# Altium footprint library Inductors&Transformers.PcbLib: 69 footprints (part 2 of 5)
Each footprint in its own frame and in the unit in brackets; x right, y up, seen from the top. Pads: shape width x height; smd on the part's side, far side on the other; paste and mask are expansions set on the pad; w line width, h text height; cw(c..) or ccw(c..) is an arc to the next point about the centre after c.
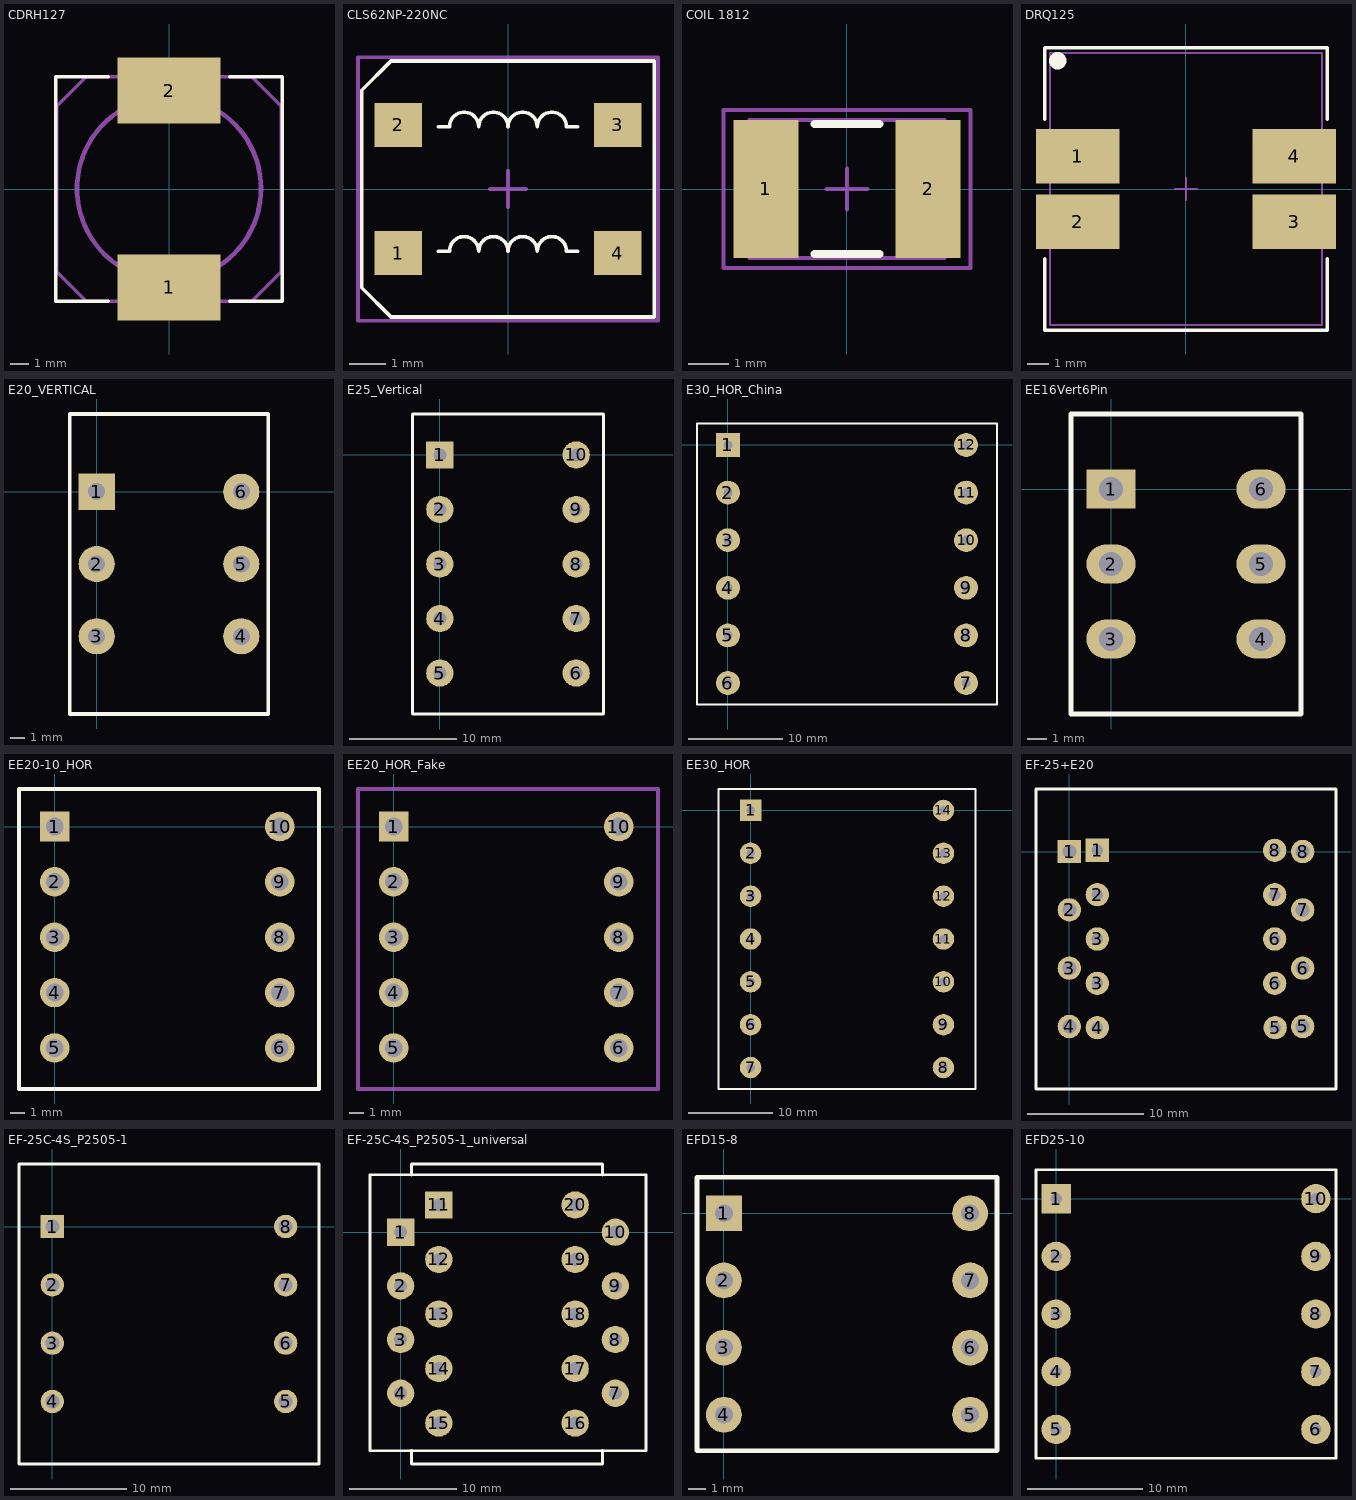
[diagram p1: the footprints below, top view; thin cyan lines are the x and y axes]

## CDRH127 [mm]
height 8
pads (2):
  rect 5.6x3.6 smd: 1(0,-5.35) 2(0,5.35)
Top Overlay:
  lines w0.178: -3.3,-6.1 -6.15,-6.1 -6.15,6.1 -3.3,6.1 ; 3.3,-6.1 6.15,-6.1 6.15,6.1 3.3,6.1
Mechanical 13:
  circle w0.254: c0,0.02 r5
  lines w0.178: -2.5,-6.1 -2.5,-6.4 2.5,-6.4 2.5,-6.1 ; -2.5,6.1 -2.5,6.4 2.5,6.4 2.5,6.1 ; -6.1,-4.5 -6.1,4.5 -4.5,6.1 4.5,6.1 6.1,4.5 6.1,-4.5 4.5,-6.1 -4.5,-6.1 -6.1,-4.5
3D body "SUMIDA-CDRH127.step": height 7.5, standoff 0.05, extent -6,-6.151 6,6.191

## CLS62NP-220NC [mm]
height 2.5
pads (4):
  rect 1.3x1.2 smd: 1(-3,-1.75) 2(-3,1.75) 3(3,1.75) 4(3,-1.75)
Top Overlay:
  lines w0.1: -1.9,-1.7 -1.6,-1.7 cw(c-1.2,-1.7) -0.8,-1.7 cw(c-0.4,-1.7) 0,-1.7 cw(c0.4,-1.7) 0.8,-1.7 cw(c1.2,-1.7) 1.6,-1.7 1.9,-1.7 ; -1.9,1.7 -1.6,1.7 cw(c-1.2,1.7) -0.8,1.7 cw(c-0.4,1.7) 0,1.7 cw(c0.4,1.7) 0.8,1.7 cw(c1.2,1.7) 1.6,1.7 1.9,1.7 ; -4,-2.7 -4,2.7 -3.2,3.5 4,3.5 4,-3.5 -3.2,-3.5 -4,-2.7
Mechanical 13:
  lines w0.1: -0.5,0 0.5,0 ; 0,-0.5 0,0.5 ; -4.1,-3.6 -4.1,3.6 4.1,3.6 4.1,-3.6 -4.1,-3.6
3D body: height 2.5, standoff 0, extent -4,-3.5 4,3.5

## COIL 1812 [mm] "Chip Coil 1812 Size"
height 2.7
pads (2):
  rect 1.6x3.4 smd: 1(-2,0) 2(2,0)
Top Overlay:
  lines w0.2: -0.8,-1.6 0.8,-1.6 ; -0.8,1.6 0.8,1.6
Mechanical 13:
  lines w0.1: -1.8,-1.7 -1.8,1.7 ; 1.8,-1.7 1.8,1.7 ; -2.4,-1.7 2.4,-1.7 2.4,1.7 -2.4,1.7 -2.4,-1.7
Mechanical 15:
  lines w0.1: -0.5,0 0.5,0 ; 0,-0.5 0,0.5 ; -3.05,-1.95 3.05,-1.95 3.05,1.95 -3.05,1.95 -3.05,-1.95
3D body "User Library-L1812.step": height 2.75, standoff 0, extent -2.4,-1.7 2.4,1.7

## DRQ125 [mm] "Coil"
height 6
pads (4):
  rect 3.85x2.5 smd: 1(-4.975,1.5) 2(-4.975,-1.5) 3(4.975,-1.5) 4(4.975,1.5)
Top Overlay:
  circle w0.5: c-5.9,5.9 r0.15
  lines w0.15: -6.5,-3.2 -6.5,-6.5 6.5,-6.5 6.5,-3.2 ; -6.5,3.2 -6.5,6.5 6.5,6.5 6.5,3.2
Mechanical 13:
  lines w0.1: -0.5,0 0.5,0 ; 0,-0.5 0,0.5 ; -6.25,-6.25 -6.25,6.25 6.25,6.25 6.25,-6.25 -6.25,-6.25
3D body "User Library-DRQ127_12_5x12_5.step": height 8, standoff 0, extent -6.25,-6.25 6.25,6.25

## E20_VERTICAL [mm]
height 21.996
pads (6):
  rect 2.54x2.54 hole 1.2: 1(0,0)
  round 2.54 hole 1.2: 2(0,-5.08) 3(0,-10.16) 4(10.16,-10.16) 5(10.16,-5.08) 6(10.16,0)
Top Overlay:
  lines w0.254: -1.905,-15.621 12.065,-15.621 12.065,5.461 -1.905,5.461 -1.905,-15.621
3D body: height 22, standoff 2.54, extent -1.904,-15.62 12.064,5.46

## E25_Vertical [mm]
height 27
pads (10):
  rect 2.54x2.54 hole 1.2: 1(0,0)
  round 2.54 hole 1.2: 2(0,-5.08) 3(0,-10.16) 4(0,-15.24) 5(0,-20.32) 6(12.7,-20.32) 7(12.7,-15.24) 8(12.7,-10.16) 9(12.7,-5.08) 10(12.7,0)
Top Overlay:
  lines w0.254: -2.54,-24.13 15.24,-24.13 15.24,3.81 -2.54,3.81 -2.54,-24.13
3D body "User Library-EE25_13_7_Vertical_transformer.step": height 26.5, standoff -3.4, extent -2.4,-23.66 15.1,3.34

## E30_HOR_China [mm]
height 22.098
pads (12):
  rect 2.54x2.54 hole 1: 1(0,0)
  round 2.54 hole 1: 2(0,-5.08) 3(0,-10.16) 4(0,-15.24) 5(0,-20.32) 6(0,-25.4) 7(25.4,-25.4) 8(25.4,-20.32) 9(25.4,-15.24) 10(25.4,-10.16) 11(25.4,-5.08) 12(25.4,0)
Top Overlay:
  lines w0.254: -3.302,-27.686 28.702,-27.686 28.702,2.286 -3.302,2.286 -3.302,-27.686
3D body: height 22.1, standoff 2.54, extent -3.429,-27.813 28.829,2.413

## EE16Vert6Pin [mm]
height 18.491
pads (6):
  rect 2.5x2 hole 1.2: 1(0,0)
  oval 2.5x2 hole 1.2: 2(0,-3.81) 3(0,-7.62) 4(7.62,-7.62) 5(7.62,-3.81) 6(7.62,0)
Top Overlay:
  lines w0.254: -2.032,-11.43 9.652,-11.43 9.652,3.81 -2.032,3.81 -2.032,-11.43
3D body "User Library-isolator_audio.STEP": height 19.01, standoff -2, extent -1.74,-12.016 9.36,4.197

## EE20-10_HOR [mm]
height 18
pads (10):
  rect 2x2 hole 1.2: 1(0,0)
  round 2 hole 1.2: 2(0,-3.75) 3(0,-7.5) 4(0,-11.25) 5(0,-15) 6(15.25,-15) 7(15.25,-11.25) 8(15.25,-7.5) 9(15.25,-3.75) 10(15.25,0)
Top Overlay:
  lines w0.254: -2.413,-17.78 -2.413,2.54 17.907,2.54 17.907,-17.78 -2.413,-17.78
3D body "User Library-E20-10pin-B66206.STEP": height 16.92, standoff -3.28, extent -3.647,-19.103 18.828,3.914

## EE20_HOR_Fake [mm]
pads (10):
  rect 2x2 hole 1.2: 1(0,0)
  round 2 hole 1.2: 2(0,-3.75) 3(0,-7.5) 4(0,-11.25) 5(0,-15) 6(15.25,-15) 7(15.25,-11.25) 8(15.25,-7.5) 9(15.25,-3.75) 10(15.25,0)
Mechanical 15:
  lines w0.254: -2.413,-17.78 17.907,-17.78 17.907,2.54 -2.413,2.54 -2.413,-17.78

## EE30_HOR [mm]
height 17.983
pads (14):
  rect 2.54x2.54 hole 1: 1(0,0)
  round 2.54 hole 1: 2(0,-5.08) 3(0,-10.16) 4(0,-15.24) 5(0,-20.32) 6(0,-25.4) 7(0,-30.48) 8(22.86,-30.48) 9(22.86,-25.4) 10(22.86,-20.32) 11(22.86,-15.24) 12(22.86,-10.16) 13(22.86,-5.08) 14(22.86,0)
Top Overlay:
  lines w0.254: -3.81,-33.02 -3.81,2.54 26.67,2.54 26.67,-33.02 -3.81,-33.02
3D body: height 17.98, standoff 2.54, extent -3.809,-33.019 26.669,2.539

## EF-25+E20 [mm]
height 20.5
pads (18):
  rect 2x2 hole 1.2: 1(0,0)
  rect 2x2 hole 1: 1(2.4,0.1)
  round 2 hole 1.2: 2(0,-5) 3(0,-10) 4(0,-15) 5(20,-15) 6(20,-10) 7(20,-5) 8(20,0)
  round 2 hole 1: 2(2.4,-3.7) 3(2.4,-11.3) 3(2.4,-7.5) 4(2.4,-15.1) 5(17.64,-15.1) 6(17.6,-11.3) 6(17.6,-7.5) 7(17.6,-3.7) 8(17.6,0.1)
Top Overlay:
  lines w0.254: -2.85,-20.359 22.85,-20.359 22.85,5.359 -2.85,5.359 -2.85,-20.359
3D body: height 20.5, standoff 0, extent -2.849,-20.359 22.849,5.359

## EF-25C-4S_P2505-1 [mm]
height 20.498
pads (8):
  rect 2x2 hole 1.2: 1(0,0)
  round 2 hole 1.2: 2(0,-5) 3(0,-10) 4(0,-15) 5(20,-15) 6(20,-10) 7(20,-5) 8(20,0)
Top Overlay:
  lines w0.254: -2.85,-20.359 22.85,-20.359 22.85,5.359 -2.85,5.359 -2.85,-20.359
3D body "User Library-Choke_E25.STEP": height 21.15, standoff -2.55, extent -3,-21 23,6

## EF-25C-4S_P2505-1_universal [mil]
height 1024
pads (18):
  rect 100x100 hole 47.24: 1(0,0) 11(140,100)
  round 100 hole 47.24: 2(0,-196.85) 3(0,-393.7) 4(0,-590.55) 7(787.4,-590.55) 8(787.4,-393.7) 9(787.4,-196.85) 10(787.4,0) 12(140,-100) 13(140,-300) 14(140,-500) 15(140,-700) 16(640,-700) 17(640,-500) 18(640,-300) 19(640,-100) 20(640,100)
Top Overlay:
  lines w10: 40,-800 40,-850 740,-850 740,-800 ; 40,210 40,250 740,250 740,210 ; -112.2,-801.55 899.61,-801.55 899.61,211 -112.2,211 -112.2,-801.55
3D body: height 1024, standoff 0, extent 40.02,-849.98 739.98,-801.57
3D body: height 1024, standoff 0, extent 40.02,211.02 739.98,249.98
3D body: height 1024, standoff 0, extent -112.18,-801.53 899.59,210.98

## EFD15-8 [mm]
height 8.5
pads (8):
  rect 2x2 hole 1: 1(0,0)
  round 2 hole 1: 2(0,-3.75) 3(0,-7.5) 4(0,-11.25) 5(13.75,-11.25) 6(13.75,-7.5) 7(13.75,-3.75) 8(13.75,0)
Top Overlay:
  lines w0.254: -1.5,-13.25 15.25,-13.25 15.25,2 -1.5,2 -1.5,-13.25
3D body "User Library-EDF15-B66414.step": height 8.41, standoff -3.39, extent -1.316,-13.2 15.116,2.1

## EFD25-10 [mm]
height 13
pads (10):
  rect 2.54x2.54 hole 1: 1(0,0)
  round 2.54 hole 1: 2(0,-5) 3(0,-10) 4(0,-15) 5(0,-20) 6(22.5,-20) 7(22.5,-15) 8(22.5,-10) 9(22.5,-5) 10(22.5,0)
Top Overlay:
  lines w0.254: -1.75,-22.5 -1.75,2.5 24.25,2.5 24.25,-22.5 -1.75,-22.5
3D body "User Library-EFD25(5+5).step": height 16.25, standoff -3.5, extent -1.8,-22.85 24.3,2.85